# Altium integrated library Altium_WCAP-ATET (rev19a).IntLib: 72 symbols
Pins are listed as number, name and electrical type; pins without a type are passive.

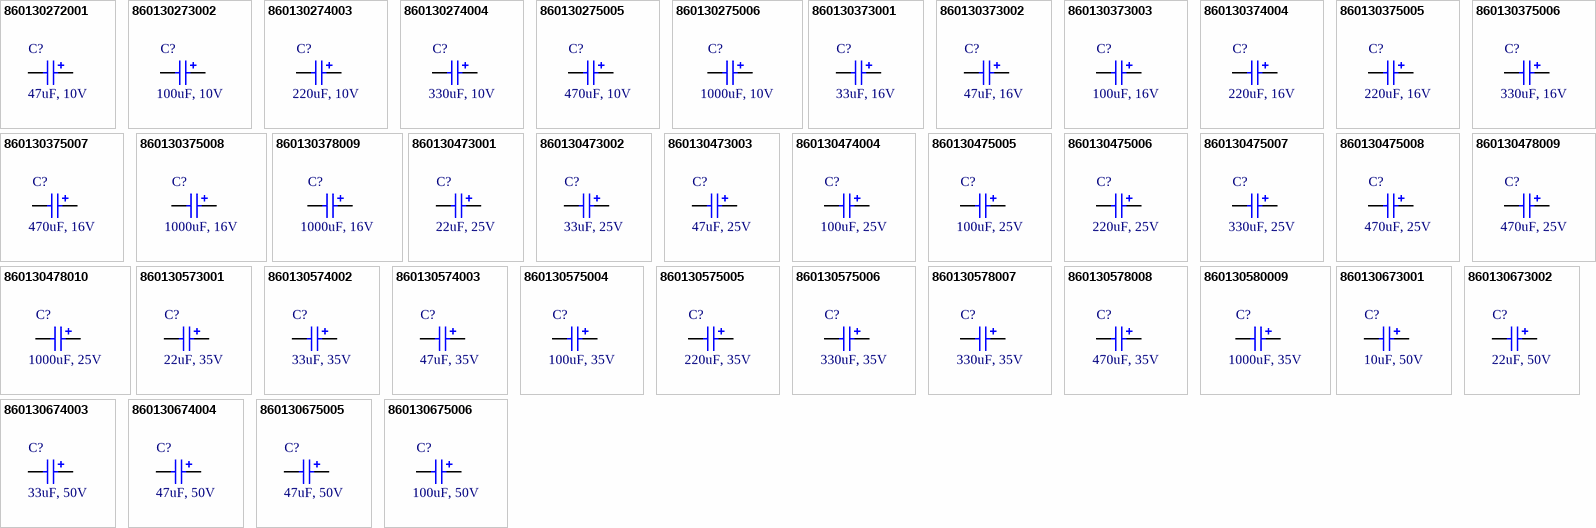
[diagram p0: symbols 860130272001 to 860130675006]

## 860130272001
designator C?, comment 47uF, 10V
WCAP-ATET THT Aluminum Electrolytic Capacitors, D5mm x L11mm, 47uF, +/-20%, 10VDC; Part Number: 860130272001; Dissipation Factor: 18%; Endurance: 1000h; Leakage Current: 4.7uA; Ripple Current max.: 92mA; Technical Reference: ATGC110470M010DSPA3A000; ComponentLink1Description: Manufacturer; ComponentLink1URL: http://www.we-online.de; ComponentLink2Description: Datasheet; ComponentLink2URL: https://katalog.we-online.com/pbs/datasheet/860130272001.pdf; Length: 11mm; Mounting Technology: THT; Operating Temperature: -40 to +125degC; Packaging: Ammo Pack; Published Date: August 2019; Capacitance: 47uF; Diameter: 5mm; Publisher: Wurth Elektronik; Capacitance Tolerance: +/-20%; Rated Voltage: 10VDC
footprint WCAP-ATET_5x11
pins: 1 N, 2 P

## 860130273002
designator C?, comment 100uF, 10V
WCAP-ATET THT Aluminum Electrolytic Capacitors, D6.3mm x L11mm, 100uF, +/-20%, 10VDC; Part Number: 860130273002; Dissipation Factor: 18%; Endurance: 1000h; Leakage Current: 10uA; Ripple Current max.: 145mA; Technical Reference: ATGD110101M010DSPA4A000; ComponentLink1Description: Manufacturer; ComponentLink1URL: http://www.we-online.de; ComponentLink2Description: Datasheet; ComponentLink2URL: https://katalog.we-online.com/pbs/datasheet/860130273002.pdf; Length: 11mm; Mounting Technology: THT; Operating Temperature: -40 to +125degC; Packaging: Ammo Pack; Published Date: August 2019; Capacitance: 100uF; Diameter: 6.3mm; Publisher: Wurth Elektronik; Capacitance Tolerance: +/-20%; Rated Voltage: 10VDC
footprint WCAP-ATET_6.3x11
pins: 1 N, 2 P

## 860130274003
designator C?, comment 220uF, 10V
WCAP-ATET THT Aluminum Electrolytic Capacitors, D8mm x L11.5mm, 220uF, +/-20%, 10VDC; Part Number: 860130274003; Dissipation Factor: 18%; Endurance: 2000h; Leakage Current: 22uA; Ripple Current max.: 330mA; Technical Reference: ATGE115221M010DSPA7B000; ComponentLink1Description: Manufacturer; ComponentLink1URL: http://www.we-online.de; ComponentLink2Description: Datasheet; ComponentLink2URL: https://katalog.we-online.com/pbs/datasheet/860130274003.pdf; Length: 11.5mm; Mounting Technology: THT; Operating Temperature: -40 to +125degC; Packaging: Ammo Pack; Published Date: August 2019; Capacitance: 220uF; Diameter: 8mm; Publisher: Wurth Elektronik; Capacitance Tolerance: +/-20%; Rated Voltage: 10VDC
footprint WCAP-ATET_8x11.5
pins: 1 N, 2 P

## 860130274004
designator C?, comment 330uF, 10V
WCAP-ATET THT Aluminum Electrolytic Capacitors, D8mm x L11.5mm, 330uF, +/-20%, 10VDC; Part Number: 860130274004; Dissipation Factor: 18%; Endurance: 2000h; Leakage Current: 33uA; Ripple Current max.: 340mA; Technical Reference: ATGE115331M010DSPA7B000; ComponentLink1Description: Manufacturer; ComponentLink1URL: http://www.we-online.de; ComponentLink2Description: Datasheet; ComponentLink2URL: https://katalog.we-online.com/pbs/datasheet/860130274004.pdf; Length: 11.5mm; Mounting Technology: THT; Operating Temperature: -40 to +125degC; Packaging: Ammo Pack; Published Date: August 2019; Capacitance: 330uF; Diameter: 8mm; Publisher: Wurth Elektronik; Capacitance Tolerance: +/-20%; Rated Voltage: 10VDC
footprint WCAP-ATET_8x11.5
pins: 1 N, 2 P

## 860130275005
designator C?, comment 470uF, 10V
WCAP-ATET THT Aluminum Electrolytic Capacitors, D10mm x L12.5mm, 470uF, +/-20%, 10VDC; Part Number: 860130275005; Dissipation Factor: 18%; Endurance: 2000h; Leakage Current: 47uA; Ripple Current max.: 505mA; Technical Reference: ATGF125471M010DSPA9B000; ComponentLink1Description: Manufacturer; ComponentLink1URL: http://www.we-online.de; ComponentLink2Description: Datasheet; ComponentLink2URL: https://katalog.we-online.com/pbs/datasheet/860130275005.pdf; Length: 12.5mm; Mounting Technology: THT; Operating Temperature: -40 to +125degC; Packaging: Ammo Pack; Published Date: August 2019; Capacitance: 470uF; Diameter: 10mm; Publisher: Wurth Elektronik; Capacitance Tolerance: +/-20%; Rated Voltage: 10VDC
footprint WCAP-ATET_10x12.5
pins: 1 N, 2 P

## 860130275006
designator C?, comment 1000uF, 10V
WCAP-ATET THT Aluminum Electrolytic Capacitors, D10mm x L16mm, 1000uF, +/-20%, 10VDC; Part Number: 860130275006; Dissipation Factor: 18%; Endurance: 2000h; Leakage Current: 100uA; Ripple Current max.: 870mA; Technical Reference: ATGF160102M010DSPAAB000; ComponentLink1Description: Manufacturer; ComponentLink1URL: http://www.we-online.de; ComponentLink2Description: Datasheet; ComponentLink2URL: https://katalog.we-online.com/pbs/datasheet/860130275006.pdf; Length: 16mm; Mounting Technology: THT; Operating Temperature: -40 to +125degC; Packaging: Ammo Pack; Published Date: August 2019; Capacitance: 1000uF; Diameter: 10mm; Publisher: Wurth Elektronik; Capacitance Tolerance: +/-20%; Rated Voltage: 10VDC
footprint WCAP-ATET_10x16
pins: 1 N, 2 P

## 860130373001
designator C?, comment 33uF, 16V
WCAP-ATET THT Aluminum Electrolytic Capacitors, D6.3mm x L11mm, 33uF, +/-20%, 16VDC; Part Number: 860130373001; Dissipation Factor: 15%; Endurance: 1000h; Leakage Current: 5.28uA; Ripple Current max.: 91mA; Technical Reference: ATGD110330M016DSPA4A000; ComponentLink1Description: Manufacturer; ComponentLink1URL: http://www.we-online.de; ComponentLink2Description: Datasheet; ComponentLink2URL: https://katalog.we-online.com/pbs/datasheet/860130373001.pdf; Length: 11mm; Mounting Technology: THT; Operating Temperature: -40 to +125degC; Packaging: Ammo Pack; Published Date: August 2019; Capacitance: 33uF; Diameter: 6.3mm; Publisher: Wurth Elektronik; Capacitance Tolerance: +/-20%; Rated Voltage: 16VDC
footprint WCAP-ATET_6.3x11
pins: 1 N, 2 P

## 860130373002
designator C?, comment 47uF, 16V
WCAP-ATET THT Aluminum Electrolytic Capacitors, D6.3mm x L11mm, 47uF, +/-20%, 16VDC; Part Number: 860130373002; Dissipation Factor: 15%; Endurance: 1000h; Leakage Current: 7.52uA; Ripple Current max.: 110mA; Technical Reference: ATGD110470M016DSPA4A000; ComponentLink1Description: Manufacturer; ComponentLink1URL: http://www.we-online.de; ComponentLink2Description: Datasheet; ComponentLink2URL: https://katalog.we-online.com/pbs/datasheet/860130373002.pdf; Length: 11mm; Mounting Technology: THT; Operating Temperature: -40 to +125degC; Packaging: Ammo Pack; Published Date: August 2019; Capacitance: 47uF; Diameter: 6.3mm; Publisher: Wurth Elektronik; Capacitance Tolerance: +/-20%; Rated Voltage: 16VDC
footprint WCAP-ATET_6.3x11
pins: 1 N, 2 P

## 860130373003
designator C?, comment 100uF, 16V
WCAP-ATET THT Aluminum Electrolytic Capacitors, D6.3mm x L11mm, 100uF, +/-20%, 16VDC; Part Number: 860130373003; Dissipation Factor: 15%; Endurance: 1000h; Leakage Current: 16uA; Ripple Current max.: 175mA; Technical Reference: ATGD110101M016DSPA4A000; ComponentLink1Description: Manufacturer; ComponentLink1URL: http://www.we-online.de; ComponentLink2Description: Datasheet; ComponentLink2URL: https://katalog.we-online.com/pbs/datasheet/860130373003.pdf; Length: 11mm; Mounting Technology: THT; Operating Temperature: -40 to +125degC; Packaging: Ammo Pack; Published Date: August 2019; Capacitance: 100uF; Diameter: 6.3mm; Publisher: Wurth Elektronik; Capacitance Tolerance: +/-20%; Rated Voltage: 16VDC
footprint WCAP-ATET_6.3x11
pins: 1 N, 2 P

## 860130374004
designator C?, comment 220uF, 16V
WCAP-ATET THT Aluminum Electrolytic Capacitors, D8mm x L11.5mm, 220uF, +/-20%, 16VDC; Part Number: 860130374004; Dissipation Factor: 15%; Endurance: 2000h; Leakage Current: 35.2uA; Ripple Current max.: 340mA; Technical Reference: ATGE115221M016DSPA7B000; ComponentLink1Description: Manufacturer; ComponentLink1URL: http://www.we-online.de; ComponentLink2Description: Datasheet; ComponentLink2URL: https://katalog.we-online.com/pbs/datasheet/860130374004.pdf; Length: 11.5mm; Mounting Technology: THT; Operating Temperature: -40 to +125degC; Packaging: Ammo Pack; Published Date: August 2019; Capacitance: 220uF; Diameter: 8mm; Publisher: Wurth Elektronik; Capacitance Tolerance: +/-20%; Rated Voltage: 16VDC
footprint WCAP-ATET_8x11.5
pins: 1 N, 2 P

## 860130375005
designator C?, comment 220uF, 16V
WCAP-ATET THT Aluminum Electrolytic Capacitors, D10mm x L12.5mm, 220uF, +/-20%, 16VDC; Part Number: 860130375005; Dissipation Factor: 15%; Endurance: 2000h; Leakage Current: 35.2uA; Ripple Current max.: 400mA; Technical Reference: ATGF125221M016DSPA9B000; ComponentLink1Description: Manufacturer; ComponentLink1URL: http://www.we-online.de; ComponentLink2Description: Datasheet; ComponentLink2URL: https://katalog.we-online.com/pbs/datasheet/860130375005.pdf; Length: 12.5mm; Mounting Technology: THT; Operating Temperature: -40 to +125degC; Packaging: Ammo Pack; Published Date: August 2019; Capacitance: 220uF; Diameter: 10mm; Publisher: Wurth Elektronik; Capacitance Tolerance: +/-20%; Rated Voltage: 16VDC
footprint WCAP-ATET_10x12.5
pins: 1 N, 2 P

## 860130375006
designator C?, comment 330uF, 16V
WCAP-ATET THT Aluminum Electrolytic Capacitors, D10mm x L12.5mm, 330uF, +/-20%, 16VDC; Part Number: 860130375006; Dissipation Factor: 15%; Endurance: 2000h; Leakage Current: 52.8uA; Ripple Current max.: 470mA; Technical Reference: ATGF125331M016DSPA9B000; ComponentLink1Description: Manufacturer; ComponentLink1URL: http://www.we-online.de; ComponentLink2Description: Datasheet; ComponentLink2URL: https://katalog.we-online.com/pbs/datasheet/860130375006.pdf; Length: 12.5mm; Mounting Technology: THT; Operating Temperature: -40 to +125degC; Packaging: Ammo Pack; Published Date: August 2019; Capacitance: 330uF; Diameter: 10mm; Publisher: Wurth Elektronik; Capacitance Tolerance: +/-20%; Rated Voltage: 16VDC
footprint WCAP-ATET_10x12.5
pins: 1 N, 2 P

## 860130375007
designator C?, comment 470uF, 16V
WCAP-ATET THT Aluminum Electrolytic Capacitors, D10mm x L16mm, 470uF, +/-20%, 16VDC; Part Number: 860130375007; Dissipation Factor: 15%; Endurance: 2000h; Leakage Current: 75.2uA; Ripple Current max.: 650mA; Technical Reference: ATGF160471M016DSPAAB000; ComponentLink1Description: Manufacturer; ComponentLink1URL: http://www.we-online.de; ComponentLink2Description: Datasheet; ComponentLink2URL: https://katalog.we-online.com/pbs/datasheet/860130375007.pdf; Length: 16mm; Mounting Technology: THT; Operating Temperature: -40 to +125degC; Packaging: Ammo Pack; Published Date: August 2019; Capacitance: 470uF; Diameter: 10mm; Publisher: Wurth Elektronik; Capacitance Tolerance: +/-20%; Rated Voltage: 16VDC
footprint WCAP-ATET_10x16
pins: 1 N, 2 P

## 860130375008
designator C?, comment 1000uF, 16V
WCAP-ATET THT Aluminum Electrolytic Capacitors, D10mm x L25mm, 1000uF, +/-20%, 16VDC; Part Number: 860130375008; Dissipation Factor: 15%; Endurance: 2000h; Leakage Current: 160uA; Ripple Current max.: 950mA; Technical Reference: ATGF250102M016DSPAAB000; ComponentLink1Description: Manufacturer; ComponentLink1URL: http://www.we-online.de; ComponentLink2Description: Datasheet; ComponentLink2URL: https://katalog.we-online.com/pbs/datasheet/860130375008.pdf; Length: 25mm; Mounting Technology: THT; Operating Temperature: -40 to +125degC; Packaging: Ammo Pack; Published Date: August 2019; Capacitance: 1000uF; Diameter: 10mm; Publisher: Wurth Elektronik; Capacitance Tolerance: +/-20%; Rated Voltage: 16VDC
footprint WCAP-ATET_10x25
pins: 1 N, 2 P

## 860130378009
designator C?, comment 1000uF, 16V
WCAP-ATET THT Aluminum Electrolytic Capacitors, D13mm x L20mm, 1000uF, +/-20%, 16VDC; Part Number: 860130378009; Dissipation Factor: 15%; Endurance: 3000h; Leakage Current: 160uA; Ripple Current max.: 1000mA; Technical Reference: ATGI200102M016DSPACC000; ComponentLink1Description: Manufacturer; ComponentLink1URL: http://www.we-online.de; ComponentLink2Description: Datasheet; ComponentLink2URL: https://katalog.we-online.com/pbs/datasheet/860130378009.pdf; Length: 20mm; Mounting Technology: THT; Operating Temperature: -40 to +125degC; Packaging: Ammo Pack; Published Date: August 2019; Capacitance: 1000uF; Diameter: 13mm; Publisher: Wurth Elektronik; Capacitance Tolerance: +/-20%; Rated Voltage: 16VDC
footprint WCAP-ATET_13x20
pins: 1 N, 2 P

## 860130473001
designator C?, comment 22uF, 25V
WCAP-ATET THT Aluminum Electrolytic Capacitors, D6.3mm x L11mm, 22uF, +/-20%, 25VDC; Part Number: 860130473001; Dissipation Factor: 13%; Endurance: 1000h; Leakage Current: 5.5uA; Ripple Current max.: 70mA; Technical Reference: ATGD110220M025DSPA4A000; ComponentLink1Description: Manufacturer; ComponentLink1URL: http://www.we-online.de; ComponentLink2Description: Datasheet; ComponentLink2URL: https://katalog.we-online.com/pbs/datasheet/860130473001.pdf; Length: 11mm; Mounting Technology: THT; Operating Temperature: -40 to +125degC; Packaging: Ammo Pack; Published Date: August 2019; Capacitance: 22uF; Diameter: 6.3mm; Publisher: Wurth Elektronik; Capacitance Tolerance: +/-20%; Rated Voltage: 25VDC
footprint WCAP-ATET_6.3x11
pins: 1 N, 2 P

## 860130473002
designator C?, comment 33uF, 25V
WCAP-ATET THT Aluminum Electrolytic Capacitors, D6.3mm x L11mm, 33uF, +/-20%, 25VDC; Part Number: 860130473002; Dissipation Factor: 13%; Endurance: 1000h; Leakage Current: 8.25uA; Ripple Current max.: 100mA; Technical Reference: ATGD110330M025DSPA4A000; ComponentLink1Description: Manufacturer; ComponentLink1URL: http://www.we-online.de; ComponentLink2Description: Datasheet; ComponentLink2URL: https://katalog.we-online.com/pbs/datasheet/860130473002.pdf; Length: 11mm; Mounting Technology: THT; Operating Temperature: -40 to +125degC; Packaging: Ammo Pack; Published Date: August 2019; Capacitance: 33uF; Diameter: 6.3mm; Publisher: Wurth Elektronik; Capacitance Tolerance: +/-20%; Rated Voltage: 25VDC
footprint WCAP-ATET_6.3x11
pins: 1 N, 2 P

## 860130473003
designator C?, comment 47uF, 25V
WCAP-ATET THT Aluminum Electrolytic Capacitors, D6.3mm x L11mm, 47uF, +/-20%, 25VDC; Part Number: 860130473003; Dissipation Factor: 13%; Endurance: 1000h; Leakage Current: 11.75uA; Ripple Current max.: 110mA; Technical Reference: ATGD110470M025DSPA4A000; ComponentLink1Description: Manufacturer; ComponentLink1URL: http://www.we-online.de; ComponentLink2Description: Datasheet; ComponentLink2URL: https://katalog.we-online.com/pbs/datasheet/860130473003.pdf; Length: 11mm; Mounting Technology: THT; Operating Temperature: -40 to +125degC; Packaging: Ammo Pack; Published Date: August 2019; Capacitance: 47uF; Diameter: 6.3mm; Publisher: Wurth Elektronik; Capacitance Tolerance: +/-20%; Rated Voltage: 25VDC
footprint WCAP-ATET_6.3x11
pins: 1 N, 2 P

## 860130474004
designator C?, comment 100uF, 25V
WCAP-ATET THT Aluminum Electrolytic Capacitors, D8mm x L11.5mm, 100uF, +/-20%, 25VDC; Part Number: 860130474004; Dissipation Factor: 13%; Endurance: 2000h; Leakage Current: 25uA; Ripple Current max.: 210mA; Technical Reference: ATGE115101M025DSPA7B000; ComponentLink1Description: Manufacturer; ComponentLink1URL: http://www.we-online.de; ComponentLink2Description: Datasheet; ComponentLink2URL: https://katalog.we-online.com/pbs/datasheet/860130474004.pdf; Length: 11.5mm; Mounting Technology: THT; Operating Temperature: -40 to +125degC; Packaging: Ammo Pack; Published Date: August 2019; Capacitance: 100uF; Diameter: 8mm; Publisher: Wurth Elektronik; Capacitance Tolerance: +/-20%; Rated Voltage: 25VDC
footprint WCAP-ATET_8x11.5
pins: 1 N, 2 P

## 860130475005
designator C?, comment 100uF, 25V
WCAP-ATET THT Aluminum Electrolytic Capacitors, D10mm x L12.5mm, 100uF, +/-20%, 25VDC; Part Number: 860130475005; Dissipation Factor: 13%; Endurance: 2000h; Leakage Current: 25uA; Ripple Current max.: 250mA; Technical Reference: ATGF125101M025DSPA9B000; ComponentLink1Description: Manufacturer; ComponentLink1URL: http://www.we-online.de; ComponentLink2Description: Datasheet; ComponentLink2URL: https://katalog.we-online.com/pbs/datasheet/860130475005.pdf; Length: 12.5mm; Mounting Technology: THT; Operating Temperature: -40 to +125degC; Packaging: Ammo Pack; Published Date: August 2019; Capacitance: 100uF; Diameter: 10mm; Publisher: Wurth Elektronik; Capacitance Tolerance: +/-20%; Rated Voltage: 25VDC
footprint WCAP-ATET_10x12.5
pins: 1 N, 2 P

## 860130475006
designator C?, comment 220uF, 25V
WCAP-ATET THT Aluminum Electrolytic Capacitors, D10mm x L12.5mm, 220uF, +/-20%, 25VDC; Part Number: 860130475006; Dissipation Factor: 13%; Endurance: 2000h; Leakage Current: 55uA; Ripple Current max.: 420mA; Technical Reference: ATGF125221M025DSPA9B000; ComponentLink1Description: Manufacturer; ComponentLink1URL: http://www.we-online.de; ComponentLink2Description: Datasheet; ComponentLink2URL: https://katalog.we-online.com/pbs/datasheet/860130475006.pdf; Length: 12.5mm; Mounting Technology: THT; Operating Temperature: -40 to +125degC; Packaging: Ammo Pack; Published Date: August 2019; Capacitance: 220uF; Diameter: 10mm; Publisher: Wurth Elektronik; Capacitance Tolerance: +/-20%; Rated Voltage: 25VDC
footprint WCAP-ATET_10x12.5
pins: 1 N, 2 P

## 860130475007
designator C?, comment 330uF, 25V
WCAP-ATET THT Aluminum Electrolytic Capacitors, D10mm x L16mm, 330uF, +/-20%, 25VDC; Part Number: 860130475007; Dissipation Factor: 13%; Endurance: 2000h; Leakage Current: 82.5uA; Ripple Current max.: 570mA; Technical Reference: ATGF160331M025DSPAAB000; ComponentLink1Description: Manufacturer; ComponentLink1URL: http://www.we-online.de; ComponentLink2Description: Datasheet; ComponentLink2URL: https://katalog.we-online.com/pbs/datasheet/860130475007.pdf; Length: 16mm; Mounting Technology: THT; Operating Temperature: -40 to +125degC; Packaging: Ammo Pack; Published Date: August 2019; Capacitance: 330uF; Diameter: 10mm; Publisher: Wurth Elektronik; Capacitance Tolerance: +/-20%; Rated Voltage: 25VDC
footprint WCAP-ATET_10x16
pins: 1 N, 2 P

## 860130475008
designator C?, comment 470uF, 25V
WCAP-ATET THT Aluminum Electrolytic Capacitors, D10mm x L25mm, 470uF, +/-20%, 25VDC; Part Number: 860130475008; Dissipation Factor: 13%; Endurance: 2000h; Leakage Current: 117.5uA; Ripple Current max.: 770mA; Technical Reference: ATGF250471M025DSPAAB000; ComponentLink1Description: Manufacturer; ComponentLink1URL: http://www.we-online.de; ComponentLink2Description: Datasheet; ComponentLink2URL: https://katalog.we-online.com/pbs/datasheet/860130475008.pdf; Length: 25mm; Mounting Technology: THT; Operating Temperature: -40 to +125degC; Packaging: Ammo Pack; Published Date: August 2019; Capacitance: 470uF; Diameter: 10mm; Publisher: Wurth Elektronik; Capacitance Tolerance: +/-20%; Rated Voltage: 25VDC
footprint WCAP-ATET_10x25
pins: 1 N, 2 P

## 860130478009
designator C?, comment 470uF, 25V
WCAP-ATET THT Aluminum Electrolytic Capacitors, D13mm x L20mm, 470uF, +/-20%, 25VDC; Part Number: 860130478009; Dissipation Factor: 13%; Endurance: 3000h; Leakage Current: 117.5uA; Ripple Current max.: 810mA; Technical Reference: ATGI200471M025DSPACC000; ComponentLink1Description: Manufacturer; ComponentLink1URL: http://www.we-online.de; ComponentLink2Description: Datasheet; ComponentLink2URL: https://katalog.we-online.com/pbs/datasheet/860130478009.pdf; Length: 20mm; Mounting Technology: THT; Operating Temperature: -40 to +125degC; Packaging: Ammo Pack; Published Date: August 2019; Capacitance: 470uF; Diameter: 13mm; Publisher: Wurth Elektronik; Capacitance Tolerance: +/-20%; Rated Voltage: 25VDC
footprint WCAP-ATET_13x20
pins: 1 N, 2 P

## 860130478010
designator C?, comment 1000uF, 25V
WCAP-ATET THT Aluminum Electrolytic Capacitors, D13mm x L25mm, 1000uF, +/-20%, 25VDC; Part Number: 860130478010; Dissipation Factor: 13%; Endurance: 3000h; Leakage Current: 250uA; Ripple Current max.: 970mA; Technical Reference: ATGI250102M025DSPACC000; ComponentLink1Description: Manufacturer; ComponentLink1URL: http://www.we-online.de; ComponentLink2Description: Datasheet; ComponentLink2URL: https://katalog.we-online.com/pbs/datasheet/860130478010.pdf; Length: 25mm; Mounting Technology: THT; Operating Temperature: -40 to +125degC; Packaging: Ammo Pack; Published Date: August 2019; Capacitance: 1000uF; Diameter: 13mm; Publisher: Wurth Elektronik; Capacitance Tolerance: +/-20%; Rated Voltage: 25VDC
footprint WCAP-ATET_13x25
pins: 1 N, 2 P

## 860130573001
designator C?, comment 22uF, 35V
WCAP-ATET THT Aluminum Electrolytic Capacitors, D6.3mm x L11mm, 22uF, +/-20%, 35VDC; Part Number: 860130573001; Dissipation Factor: 12%; Endurance: 1000h; Leakage Current: 7.7uA; Ripple Current max.: 82mA; Technical Reference: ATGD110220M035DSPA4A000; ComponentLink1Description: Manufacturer; ComponentLink1URL: http://www.we-online.de; ComponentLink2Description: Datasheet; ComponentLink2URL: https://katalog.we-online.com/pbs/datasheet/860130573001.pdf; Length: 11mm; Mounting Technology: THT; Operating Temperature: -40 to +125degC; Packaging: Ammo Pack; Published Date: August 2019; Capacitance: 22uF; Diameter: 6.3mm; Publisher: Wurth Elektronik; Capacitance Tolerance: +/-20%; Rated Voltage: 35VDC
footprint WCAP-ATET_6.3x11
pins: 1 N, 2 P

## 860130574002
designator C?, comment 33uF, 35V
WCAP-ATET THT Aluminum Electrolytic Capacitors, D8mm x L11.5mm, 33uF, +/-20%, 35VDC; Part Number: 860130574002; Dissipation Factor: 12%; Endurance: 2000h; Leakage Current: 11.55uA; Ripple Current max.: 108mA; Technical Reference: ATGE115330M035DSPA7B000; ComponentLink1Description: Manufacturer; ComponentLink1URL: http://www.we-online.de; ComponentLink2Description: Datasheet; ComponentLink2URL: https://katalog.we-online.com/pbs/datasheet/860130574002.pdf; Length: 11.5mm; Mounting Technology: THT; Operating Temperature: -40 to +125degC; Packaging: Ammo Pack; Published Date: August 2019; Capacitance: 33uF; Diameter: 8mm; Publisher: Wurth Elektronik; Capacitance Tolerance: +/-20%; Rated Voltage: 35VDC
footprint WCAP-ATET_8x11.5
pins: 1 N, 2 P

## 860130574003
designator C?, comment 47uF, 35V
WCAP-ATET THT Aluminum Electrolytic Capacitors, D8mm x L11.5mm, 47uF, +/-20%, 35VDC; Part Number: 860130574003; Dissipation Factor: 12%; Endurance: 2000h; Leakage Current: 16.45uA; Ripple Current max.: 130mA; Technical Reference: ATGE115470M035DSPA7B000; ComponentLink1Description: Manufacturer; ComponentLink1URL: http://www.we-online.de; ComponentLink2Description: Datasheet; ComponentLink2URL: https://katalog.we-online.com/pbs/datasheet/860130574003.pdf; Length: 11.5mm; Mounting Technology: THT; Operating Temperature: -40 to +125degC; Packaging: Ammo Pack; Published Date: August 2019; Capacitance: 47uF; Diameter: 8mm; Publisher: Wurth Elektronik; Capacitance Tolerance: +/-20%; Rated Voltage: 35VDC
footprint WCAP-ATET_8x11.5
pins: 1 N, 2 P

## 860130575004
designator C?, comment 100uF, 35V
WCAP-ATET THT Aluminum Electrolytic Capacitors, D10mm x L12.5mm, 100uF, +/-20%, 35VDC; Part Number: 860130575004; Dissipation Factor: 12%; Endurance: 2000h; Leakage Current: 35uA; Ripple Current max.: 230mA; Technical Reference: ATGF125101M035DSPA9B000; ComponentLink1Description: Manufacturer; ComponentLink1URL: http://www.we-online.de; ComponentLink2Description: Datasheet; ComponentLink2URL: https://katalog.we-online.com/pbs/datasheet/860130575004.pdf; Length: 12.5mm; Mounting Technology: THT; Operating Temperature: -40 to +125degC; Packaging: Ammo Pack; Published Date: August 2019; Capacitance: 100uF; Diameter: 10mm; Publisher: Wurth Elektronik; Capacitance Tolerance: +/-20%; Rated Voltage: 35VDC
footprint WCAP-ATET_10x12.5
pins: 1 N, 2 P

## 860130575005
designator C?, comment 220uF, 35V
WCAP-ATET THT Aluminum Electrolytic Capacitors, D10mm x L16mm, 220uF, +/-20%, 35VDC; Part Number: 860130575005; Dissipation Factor: 12%; Endurance: 2000h; Leakage Current: 77uA; Ripple Current max.: 480mA; Technical Reference: ATGF160221M035DSPAAB000; ComponentLink1Description: Manufacturer; ComponentLink1URL: http://www.we-online.de; ComponentLink2Description: Datasheet; ComponentLink2URL: https://katalog.we-online.com/pbs/datasheet/860130575005.pdf; Length: 16mm; Mounting Technology: THT; Operating Temperature: -40 to +125degC; Packaging: Ammo Pack; Published Date: August 2019; Capacitance: 220uF; Diameter: 10mm; Publisher: Wurth Elektronik; Capacitance Tolerance: +/-20%; Rated Voltage: 35VDC
footprint WCAP-ATET_10x16
pins: 1 N, 2 P

## 860130575006
designator C?, comment 330uF, 35V
WCAP-ATET THT Aluminum Electrolytic Capacitors, D10mm x L25mm, 330uF, +/-20%, 35VDC; Part Number: 860130575006; Dissipation Factor: 12%; Endurance: 2000h; Leakage Current: 115.5uA; Ripple Current max.: 680mA; Technical Reference: ATGF250331M035DSPAAB000; ComponentLink1Description: Manufacturer; ComponentLink1URL: http://www.we-online.de; ComponentLink2Description: Datasheet; ComponentLink2URL: https://katalog.we-online.com/pbs/datasheet/860130575006.pdf; Length: 25mm; Mounting Technology: THT; Operating Temperature: -40 to +125degC; Packaging: Ammo Pack; Published Date: August 2019; Capacitance: 330uF; Diameter: 10mm; Publisher: Wurth Elektronik; Capacitance Tolerance: +/-20%; Rated Voltage: 35VDC
footprint WCAP-ATET_10x25
pins: 1 N, 2 P

## 860130578007
designator C?, comment 330uF, 35V
WCAP-ATET THT Aluminum Electrolytic Capacitors, D13mm x L20mm, 330uF, +/-20%, 35VDC; Part Number: 860130578007; Dissipation Factor: 12%; Endurance: 3000h; Leakage Current: 115.5uA; Ripple Current max.: 718mA; Technical Reference: ATGI200331M035DSPACC000; ComponentLink1Description: Manufacturer; ComponentLink1URL: http://www.we-online.de; ComponentLink2Description: Datasheet; ComponentLink2URL: https://katalog.we-online.com/pbs/datasheet/860130578007.pdf; Length: 20mm; Mounting Technology: THT; Operating Temperature: -40 to +125degC; Packaging: Ammo Pack; Published Date: August 2019; Capacitance: 330uF; Diameter: 13mm; Publisher: Wurth Elektronik; Capacitance Tolerance: +/-20%; Rated Voltage: 35VDC
footprint WCAP-ATET_13x20
pins: 1 N, 2 P

## 860130578008
designator C?, comment 470uF, 35V
WCAP-ATET THT Aluminum Electrolytic Capacitors, D13mm x L20mm, 470uF, +/-20%, 35VDC; Part Number: 860130578008; Dissipation Factor: 12%; Endurance: 3000h; Leakage Current: 164.5uA; Ripple Current max.: 810mA; Technical Reference: ATGI200471M035DSPACC000; ComponentLink1Description: Manufacturer; ComponentLink1URL: http://www.we-online.de; ComponentLink2Description: Datasheet; ComponentLink2URL: https://katalog.we-online.com/pbs/datasheet/860130578008.pdf; Length: 20mm; Mounting Technology: THT; Operating Temperature: -40 to +125degC; Packaging: Ammo Pack; Published Date: August 2019; Capacitance: 470uF; Diameter: 13mm; Publisher: Wurth Elektronik; Capacitance Tolerance: +/-20%; Rated Voltage: 35VDC
footprint WCAP-ATET_13x20
pins: 1 N, 2 P

## 860130580009
designator C?, comment 1000uF, 35V
WCAP-ATET THT Aluminum Electrolytic Capacitors, D16mm x L25mm, 1000uF, +/-20%, 35VDC; Part Number: 860130580009; Dissipation Factor: 12%; Endurance: 3000h; Leakage Current: 350uA; Ripple Current max.: 1080mA; Technical Reference: ATGK250102M035DSPAEC000; ComponentLink1Description: Manufacturer; ComponentLink1URL: http://www.we-online.de; ComponentLink2Description: Datasheet; ComponentLink2URL: https://katalog.we-online.com/pbs/datasheet/860130580009.pdf; Length: 25mm; Mounting Technology: THT; Operating Temperature: -40 to +125degC; Packaging: Ammo Pack; Published Date: August 2019; Capacitance: 1000uF; Diameter: 16mm; Publisher: Wurth Elektronik; Capacitance Tolerance: +/-20%; Rated Voltage: 35VDC
footprint WCAP-ATET_16x25
pins: 1 N, 2 P

## 860130673001
designator C?, comment 10uF, 50V
WCAP-ATET THT Aluminum Electrolytic Capacitors, D6.3mm x L11mm, 10uF, +/-20%, 50VDC; Part Number: 860130673001; Dissipation Factor: 10%; Endurance: 1000h; Leakage Current: 5uA; Ripple Current max.: 48mA; Technical Reference: ATGD110100M050DSPA4A000; ComponentLink1Description: Manufacturer; ComponentLink1URL: http://www.we-online.de; ComponentLink2Description: Datasheet; ComponentLink2URL: https://katalog.we-online.com/pbs/datasheet/860130673001.pdf; Length: 11mm; Mounting Technology: THT; Operating Temperature: -40 to +125degC; Packaging: Ammo Pack; Published Date: August 2019; Capacitance: 10uF; Diameter: 6.3mm; Publisher: Wurth Elektronik; Capacitance Tolerance: +/-20%; Rated Voltage: 50VDC
footprint WCAP-ATET_6.3x11
pins: 1 N, 2 P
